# Altium footprint library Package_DFN_QFN.PcbLib: 557 footprints (part 8 of 35)
Each footprint in its own frame and in the unit in brackets; x right, y up, seen from the top. Pads: shape width x height; smd on the part's side, far side on the other; paste and mask are expansions set on the pad; w line width, h text height; cw(c..) or ccw(c..) is an arc to the next point about the centre after c.
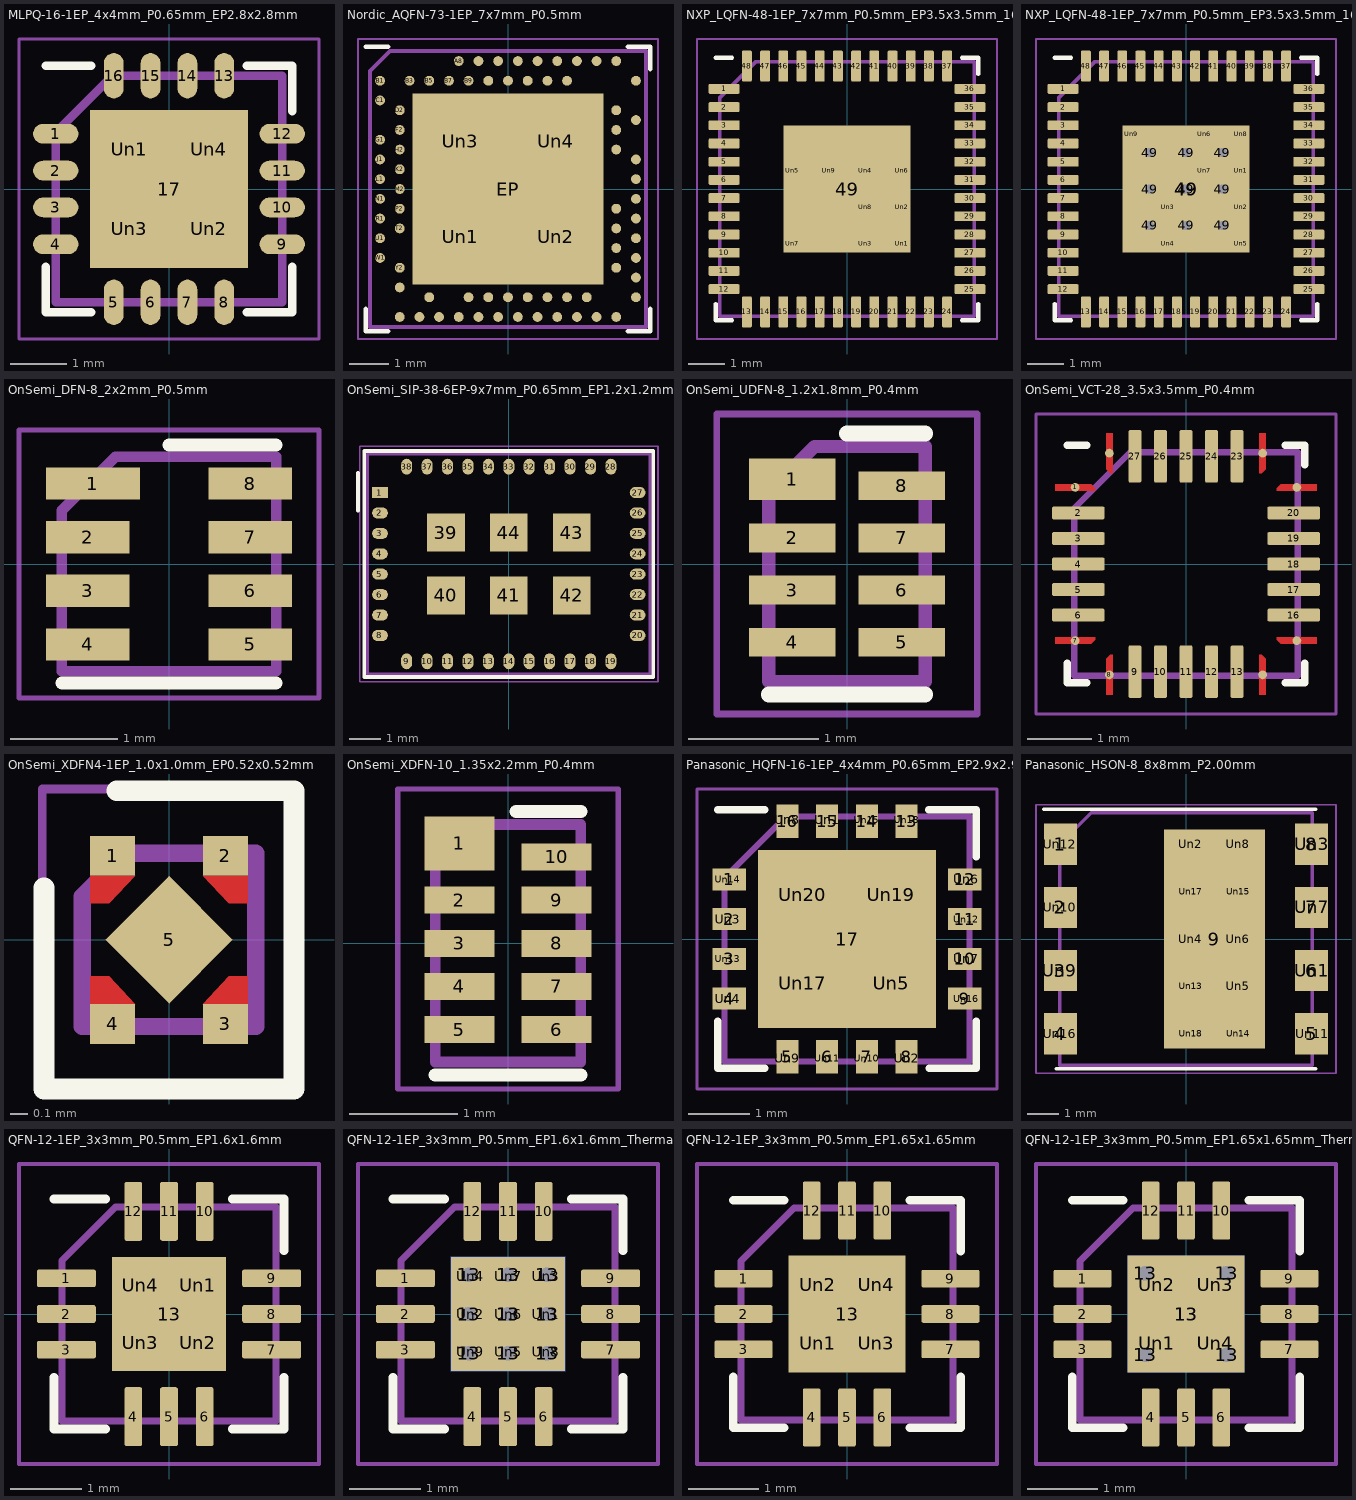
[diagram p7: the footprints below, top view; thin cyan lines are the x and y axes]

## MLPQ-16-1EP_4x4mm_P0.65mm_EP2.8x2.8mm [mm]
pads (21):
  rrect100% 0.8x0.35 smd: 1(-2,0.975) 2(-2,0.325) 3(-2,-0.325) 4(-2,-0.975) 9(2,-0.975) 10(2,-0.325) 11(2,0.325) 12(2,0.975)
  rrect100% 0.35x0.8 smd: 5(-0.975,-2) 6(-0.325,-2) 7(0.325,-2) 8(0.975,-2) 13(0.975,2) 14(0.325,2) 15(-0.325,2) 16(-0.975,2)
  rect 2.8x2.8 smd: 17(0,0)
  rect 1.13x1.13 on Top Paste: Un1(-0.7,0.7) Un2(0.7,-0.7) Un3(-0.7,-0.7) Un4(0.7,0.7)
F.SilkS:
  lines w0.15: -2.175,-1.375 -2.175,-2.175 -1.375,-2.175 ; -2.175,2.175 -1.375,2.175 ; 1.375,-2.175 2.175,-2.175 2.175,-1.375 ; 1.375,2.175 2.175,2.175 2.175,1.375
F.CrtYd:
  lines w0.05: -2.65,-2.65 2.65,-2.65 2.65,2.65 -2.65,2.65 -2.65,-2.65
F.Fab:
  lines w0.15: -2,-2 -2,1 -1,2 2,2 2,-2 -2,-2
  text "'.Designator'" at -4.047,-0.84 h1

## Nordic_AQFN-73-1EP_7x7mm_P0.5mm [mm]
pads (78):
  round 0.25 smd: A8(-1.25,3.25) A10(-0.75,3.25) A12(-0.25,3.25) A14(0.25,3.25) A16(0.75,3.25) A18(1.25,3.25) A20(1.75,3.25) A22(2.25,3.25) A23(2.75,3.25) AA24(3.25,-2.25) AB2(-2.75,-2.5) AC5(-2,-2.75) AC9(-1,-2.75) AC11(-0.5,-2.75) AC13(0,-2.75) AC15(0.5,-2.75) AC17(1,-2.75) AC19(1.5,-2.75) AC21(2,-2.75) AC24(3.25,-2.75) AD2(-2.75,-3.25) AD4(-2.25,-3.25) AD6(-1.75,-3.25) AD8(-1.25,-3.25) AD10(-0.75,-3.25) AD12(-0.25,-3.25) AD14(0.25,-3.25) AD16(0.75,-3.25) AD18(1.25,-3.25) AD20(1.75,-3.25) AD22(2.25,-3.25) AD23(2.75,-3.25) B1(-3.25,2.75) B3(-2.5,2.75) B5(-2,2.75) B7(-1.5,2.75) B9(-1,2.75) B11(-0.5,2.75) B13(0,2.75) B15(0.5,2.75) B17(1,2.75) B19(1.5,2.75) B24(3.25,2.75) C1(-3.25,2.25) D2(-2.75,2) D23(2.75,2) E24(3.25,1.75) F2(-2.75,1.5) F23(2.75,1.5) G1(-3.25,1.25) H2(-2.75,1) H23(2.75,1) J1(-3.25,0.75) J24(3.25,0.75) K2(-2.75,0.5) L1(-3.25,0.25) L24(3.25,0.25) M2(-2.75,0) N1(-3.25,-0.25) N24(3.25,-0.25) P2(-2.75,-0.5) P23(2.75,-0.5) R1(-3.25,-0.75) R24(3.25,-0.75) T2(-2.75,-1) T23(2.75,-1) U1(-3.25,-1.25) U24(3.25,-1.25) V23(2.75,-1.5) W1(-3.25,-1.75) W24(3.25,-1.75) Y2(-2.75,-2) Y23(2.75,-2)
  rect 4.85x4.85 smd: EP(0,0)
  rect 2x2 on Top Paste: Un1(-1.212,-1.212) Un2(1.212,-1.212) Un3(-1.212,1.212) Un4(1.212,1.212)
F.SilkS:
  lines w0.12: -3.61,-3.05 -3.61,-3.61 -3.05,-3.61 ; -3.61,3.61 -3.05,3.61 ; 3.05,-3.61 3.61,-3.61 3.61,-3.05 ; 3.05,3.61 3.61,3.61 3.61,3.05
F.CrtYd:
  lines w0.05: -3.81,-3.81 -3.81,3.81 3.81,3.81 3.81,-3.81 -3.81,-3.81
F.Fab:
  lines w0.1: -3.5,-3.5 -3.5,3 -3,3.5 3.5,3.5 3.5,-3.5 -3.5,-3.5
  text "'.Designator'" at -4.047,-0.84 h1

## NXP_LQFN-48-1EP_7x7mm_P0.5mm_EP3.5x3.5mm_16xMask0.45x0.45 [mm]
pads (65):
  rrect25% 0.85x0.27 smd: 1(-3.375,2.75) 2(-3.375,2.25) 3(-3.375,1.75) 4(-3.375,1.25) 5(-3.375,0.75) 6(-3.375,0.25) 7(-3.375,-0.25) 8(-3.375,-0.75) 9(-3.375,-1.25) 10(-3.375,-1.75) 11(-3.375,-2.25) 12(-3.375,-2.75) 25(3.375,-2.75) 26(3.375,-2.25) 27(3.375,-1.75) 28(3.375,-1.25) 29(3.375,-0.75) 30(3.375,-0.25) 31(3.375,0.25) 32(3.375,0.75) 33(3.375,1.25) 34(3.375,1.75) 35(3.375,2.25) 36(3.375,2.75)
  rrect25% 0.27x0.85 smd: 13(-2.75,-3.375) 14(-2.25,-3.375) 15(-1.75,-3.375) 16(-1.25,-3.375) 17(-0.75,-3.375) 18(-0.25,-3.375) 19(0.25,-3.375) 20(0.75,-3.375) 21(1.25,-3.375) 22(1.75,-3.375) 23(2.25,-3.375) 24(2.75,-3.375) 37(2.75,3.375) 38(2.25,3.375) 39(1.75,3.375) 40(1.25,3.375) 41(0.75,3.375) 42(0.25,3.375) 43(-0.25,3.375) 44(-0.75,3.375) 45(-1.25,3.375) 46(-1.75,3.375) 47(-2.25,3.375) 48(-2.75,3.375)
  rect 3.5x3.5 smd: 49(0,0)
  rect 0.45x0.45 on Top Paste: Un1(1.5,-1.5) Un2(1.5,-0.5) Un3(0.5,-1.5) Un4(0.5,0.5) Un5(-1.5,0.5) Un6(1.5,0.5) Un7(-1.5,-1.5) Un8(0.5,-0.5) Un9(-0.5,0.5) Un10(-0.5,-0.5) Un11(-1.5,-0.5) Un12(1.5,1.5) Un13(-0.5,1.5) Un14(0.5,1.5) Un15(-1.5,1.5) Un16(-0.5,-1.5)
F.SilkS:
  lines w0.12: -3.61,-3.16 -3.61,-3.61 -3.16,-3.61 ; -3.61,3.61 -3.16,3.61 ; 3.16,-3.61 3.61,-3.61 3.61,-3.16 ; 3.16,3.61 3.61,3.61 3.61,3.16
F.CrtYd:
  lines w0.05: -4.12,-4.12 4.12,-4.12 4.12,4.12 -4.12,4.12 -4.12,-4.12
F.Fab:
  lines w0.1: -3.5,-3.5 3.5,-3.5 3.5,3.5 -2.5,3.5 -3.5,2.5 -3.5,-3.5
  text "'.Designator'" at -4.047,-0.84 h1

## NXP_LQFN-48-1EP_7x7mm_P0.5mm_EP3.5x3.5mm_16xMask0.45x0.45_ThermalVias [mm]
pads (75):
  rrect25% 0.85x0.27 smd: 1(-3.375,2.75) 2(-3.375,2.25) 3(-3.375,1.75) 4(-3.375,1.25) 5(-3.375,0.75) 6(-3.375,0.25) 7(-3.375,-0.25) 8(-3.375,-0.75) 9(-3.375,-1.25) 10(-3.375,-1.75) 11(-3.375,-2.25) 12(-3.375,-2.75) 25(3.375,-2.75) 26(3.375,-2.25) 27(3.375,-1.75) 28(3.375,-1.25) 29(3.375,-0.75) 30(3.375,-0.25) 31(3.375,0.25) 32(3.375,0.75) 33(3.375,1.25) 34(3.375,1.75) 35(3.375,2.25) 36(3.375,2.75)
  rrect25% 0.27x0.85 smd: 13(-2.75,-3.375) 14(-2.25,-3.375) 15(-1.75,-3.375) 16(-1.25,-3.375) 17(-0.75,-3.375) 18(-0.25,-3.375) 19(0.25,-3.375) 20(0.75,-3.375) 21(1.25,-3.375) 22(1.75,-3.375) 23(2.25,-3.375) 24(2.75,-3.375) 37(2.75,3.375) 38(2.25,3.375) 39(1.75,3.375) 40(1.25,3.375) 41(0.75,3.375) 42(0.25,3.375) 43(-0.25,3.375) 44(-0.75,3.375) 45(-1.25,3.375) 46(-1.75,3.375) 47(-2.25,3.375) 48(-2.75,3.375)
  round 0.55 hole 0.25: 49(-1,-1) 49(-1,0) 49(-1,1) 49(0,-1) 49(0,0) 49(0,1) 49(1,-1) 49(1,0) 49(1,1)
  rrect12% 2.55x2.55 smd far side: 49(0,0)
  rect 3.5x3.5 smd: 49(0,0)
  rect 0.45x0.45 on Top Paste: Un1(1.5,0.5) Un2(1.5,-0.5) Un3(-0.5,-0.5) Un4(-0.5,-1.5) Un5(1.5,-1.5) Un6(0.5,1.5) Un7(0.5,0.5) Un8(1.5,1.5) Un9(-1.5,1.5) Un10(0.5,-1.5) Un11(-0.5,0.5) Un12(-1.5,-1.5) Un13(-1.5,-0.5) Un14(-1.5,0.5) Un15(-0.5,1.5) Un16(0.5,-0.5)
F.SilkS:
  lines w0.12: -3.61,-3.16 -3.61,-3.61 -3.16,-3.61 ; -3.61,3.61 -3.16,3.61 ; 3.16,-3.61 3.61,-3.61 3.61,-3.16 ; 3.16,3.61 3.61,3.61 3.61,3.16
F.CrtYd:
  lines w0.05: -4.12,-4.12 4.12,-4.12 4.12,4.12 -4.12,4.12 -4.12,-4.12
F.Fab:
  lines w0.1: -3.5,-3.5 3.5,-3.5 3.5,3.5 -2.5,3.5 -3.5,2.5 -3.5,-3.5
  text "'.Designator'" at -4.047,-0.84 h1

## OnSemi_DFN-8_2x2mm_P0.5mm [mm]
pads (8):
  rect 0.88x0.3 smd: 1(-0.71,0.75)
  rect 0.78x0.3 smd: 2(-0.76,0.25) 3(-0.76,-0.25) 4(-0.76,-0.75) 5(0.76,-0.75) 6(0.76,-0.25) 7(0.76,0.25) 8(0.76,0.75)
F.SilkS:
  lines w0.12: -1,-1.11 1,-1.11 ; 0,1.11 1,1.11
F.CrtYd:
  lines w0.05: -1.4,-1.25 1.4,-1.25 1.4,1.25 -1.4,1.25 -1.4,-1.25
F.Fab:
  lines w0.1: -1,-1 -1,0.5 -0.5,1 1,1 1,-1 -1,-1
  text "'.Designator'" at -1.619,-0.336 h0.4

## OnSemi_SIP-38-6EP-9x7mm_P0.65mm_EP1.2x1.2mm [mm]
pads (44):
  rect 0.5x0.35 smd: 1(-4.1,2.275)
  rrect100% 0.501x0.351 smd: 2(-4.1,1.625) 3(-4.1,0.975) 4(-4.1,0.325) 5(-4.1,-0.325) 6(-4.1,-0.975) 7(-4.1,-1.625) 8(-4.1,-2.275) 20(4.1,-2.275) 21(4.1,-1.625) 22(4.1,-0.975) 23(4.1,-0.325) 24(4.1,0.325) 25(4.1,0.975) 26(4.1,1.625) 27(4.1,2.275)
  rrect100% 0.351x0.501 smd: 9(-3.25,-3.1) 10(-2.6,-3.1) 11(-1.95,-3.1) 12(-1.3,-3.1) 13(-0.65,-3.1) 14(0,-3.1) 15(0.65,-3.1) 16(1.3,-3.1) 17(1.95,-3.1) 18(2.6,-3.1) 19(3.25,-3.1) 28(3.25,3.1) 29(2.6,3.1) 30(1.95,3.1) 31(1.3,3.1) 32(0.65,3.1) 33(0,3.1) 34(-0.65,3.1) 35(-1.3,3.1) 36(-1.95,3.1) 37(-2.6,3.1) 38(-3.25,3.1)
  rect 1.2x1.2 smd: 39(-2,1) 40(-2,-1) 41(0,-1) 42(2,-1) 43(2,1) 44(0,1)
F.SilkS:
  lines w0.12: -4.8,1.7 -4.8,2.9 ; -4.6,-3.6 -4.6,3.6 4.6,3.6 4.6,-3.6 -4.6,-3.6
F.CrtYd:
  lines w0.05: -4.75,-3.75 -4.75,3.75 4.75,3.75 4.75,-3.75 -4.75,-3.75
F.Fab:
  lines w0.1: -4.5,-3.5 -4.5,3.5 4.5,3.5 4.5,-3.5 -4.5,-3.5
  text "'.Designator'" at -4.047,-0.84 h1

## OnSemi_UDFN-8_1.2x1.8mm_P0.4mm [mm]
pads (8):
  rect 0.66x0.32 smd: 1(-0.42,0.65)
  rect 0.66x0.22 smd: 2(-0.42,0.2) 3(-0.42,-0.2) 4(-0.42,-0.6) 5(0.42,-0.6) 6(0.42,-0.2) 7(0.42,0.2) 8(0.42,0.6)
F.SilkS:
  lines w0.12: -0.6,-1 0.6,-1 ; 0,1 0.6,1
F.CrtYd:
  lines w0.05: -1,-1.15 1,-1.15 1,1.15 -1,1.15 -1,-1.15
F.Fab:
  lines w0.1: -0.6,-0.9 0.6,-0.9 0.6,0.9 -0.25,0.9 -0.6,0.55 -0.6,-0.9
  text "'.Designator'" at 0.307,-1.219 h0.3

## OnSemi_VCT-28_3.5x3.5mm_P0.4mm [mm]
pads (28):
  round 0.136 smd: 1(-1.737,1.2) 7(-1.737,-1.2) 8(-1.2,-1.737) 14(1.2,-1.737) 15(1.737,-1.2) 21(1.737,1.2) 22(1.2,1.737) 28(-1.2,1.737)
  rrect25% 0.825x0.2 smd: 2(-1.687,0.8) 3(-1.687,0.4) 4(-1.687,0) 5(-1.687,-0.4) 6(-1.687,-0.8) 16(1.687,-0.8) 17(1.687,-0.4) 18(1.687,0) 19(1.687,0.4) 20(1.687,0.8)
  rrect25% 0.2x0.825 smd: 9(-0.8,-1.687) 10(-0.4,-1.687) 11(0,-1.687) 12(0.4,-1.687) 13(0.8,-1.687) 23(0.8,1.687) 24(0.4,1.687) 25(0,1.687) 26(-0.4,1.687) 27(-0.8,1.687)
F.Cu:
  region: -1.425,1.189 -1.425,1.15 -2.05,1.15 -2.05,1.25 -1.486,1.25
  region: -1.425,-1.189 -1.486,-1.25 -2.05,-1.25 -2.05,-1.15 -1.425,-1.15
  region: -1.15,-2.05 -1.25,-2.05 -1.25,-1.486 -1.189,-1.425 -1.15,-1.425
  region: 1.25,-1.486 1.25,-2.05 1.15,-2.05 1.15,-1.425 1.189,-1.425
  region: 2.05,-1.25 1.486,-1.25 1.425,-1.189 1.425,-1.15 2.05,-1.15
  region: 2.05,1.15 1.425,1.15 1.425,1.189 1.486,1.25 2.05,1.25
  region: 1.25,1.486 1.189,1.425 1.15,1.425 1.15,2.05 1.25,2.05
  region: -1.15,1.425 -1.189,1.425 -1.25,1.486 -1.25,2.05 -1.15,2.05
F.SilkS:
  lines w0.12: -1.86,-1.56 -1.86,-1.86 -1.56,-1.86 ; -1.86,1.86 -1.56,1.86 ; 1.56,-1.86 1.86,-1.86 1.86,-1.56 ; 1.56,1.86 1.86,1.86 1.86,1.56
F.Paste:
  region: -1.425,1.189 -1.425,1.15 -2.05,1.15 -2.05,1.25 -1.486,1.25
  region: -1.425,-1.189 -1.486,-1.25 -2.05,-1.25 -2.05,-1.15 -1.425,-1.15
  region: -1.15,-2.05 -1.25,-2.05 -1.25,-1.486 -1.189,-1.425 -1.15,-1.425
  region: 1.25,-1.486 1.25,-2.05 1.15,-2.05 1.15,-1.425 1.189,-1.425
  region: 2.05,-1.25 1.486,-1.25 1.425,-1.189 1.425,-1.15 2.05,-1.15
  region: 2.05,1.15 1.425,1.15 1.425,1.189 1.486,1.25 2.05,1.25
  region: 1.25,1.486 1.189,1.425 1.15,1.425 1.15,2.05 1.25,2.05
  region: -1.15,1.425 -1.189,1.425 -1.25,1.486 -1.25,2.05 -1.15,2.05
F.Mask:
  region: -1.425,1.189 -1.425,1.15 -2.05,1.15 -2.05,1.25 -1.486,1.25
  region: -1.425,-1.189 -1.486,-1.25 -2.05,-1.25 -2.05,-1.15 -1.425,-1.15
  region: -1.15,-2.05 -1.25,-2.05 -1.25,-1.486 -1.189,-1.425 -1.15,-1.425
  region: 1.25,-1.486 1.25,-2.05 1.15,-2.05 1.15,-1.425 1.189,-1.425
  region: 2.05,-1.25 1.486,-1.25 1.425,-1.189 1.425,-1.15 2.05,-1.15
  region: 2.05,1.15 1.425,1.15 1.425,1.189 1.486,1.25 2.05,1.25
  region: 1.25,1.486 1.189,1.425 1.15,1.425 1.15,2.05 1.25,2.05
  region: -1.15,1.425 -1.189,1.425 -1.25,1.486 -1.25,2.05 -1.15,2.05
F.CrtYd:
  lines w0.05: -2.35,-2.35 2.35,-2.35 2.35,2.35 -2.35,2.35 -2.35,-2.35
F.Fab:
  lines w0.1: -1.75,-1.75 1.75,-1.75 1.75,1.75 -0.875,1.75 -1.75,0.875 -1.75,-1.75
  text "'.Designator'" at -3.559,-0.737 h0.88

## OnSemi_XDFN4-1EP_1.0x1.0mm_EP0.52x0.52mm [mm]
pads (5):
  rect 0.26x0.23 smd: 1(-0.325,0.485) 2(0.325,0.485) 3(0.325,-0.485) 4(-0.325,-0.485)
  rect 0.52x0.52 smd rot 45: 5(0,0)
F.Cu:
  region: -0.345,0.21 -0.455,0.21 -0.455,0.37 -0.195,0.37
  region: 0.455,0.21 0.345,0.21 0.195,0.37 0.455,0.37
  region: 0.455,-0.37 0.195,-0.37 0.345,-0.21 0.455,-0.21
  region: -0.195,-0.37 -0.455,-0.37 -0.455,-0.21 -0.345,-0.21
F.SilkS:
  lines w0.12: -0.72,0.3 -0.72,-0.86 0.72,-0.86 0.72,0.86 -0.3,0.86
F.Paste:
  region: -0.345,0.21 -0.455,0.21 -0.455,0.37 -0.195,0.37
  region: 0.455,0.21 0.345,0.21 0.195,0.37 0.455,0.37
  region: 0.455,-0.37 0.195,-0.37 0.345,-0.21 0.455,-0.21
  region: -0.195,-0.37 -0.455,-0.37 -0.455,-0.21 -0.345,-0.21
F.Mask:
  region: -0.345,0.21 -0.455,0.21 -0.455,0.37 -0.195,0.37
  region: 0.455,0.21 0.345,0.21 0.195,0.37 0.455,0.37
  region: 0.455,-0.37 0.195,-0.37 0.345,-0.21 0.455,-0.21
  region: -0.195,-0.37 -0.455,-0.37 -0.455,-0.21 -0.345,-0.21
F.CrtYd:
  lines w0.05: -0.73,-0.85 0.73,-0.85 0.73,0.87 -0.73,0.87 -0.73,-0.85
F.Fab:
  lines w0.1: -0.5,-0.5 -0.5,0.25 -0.25,0.5 0.5,0.5 0.5,-0.5 -0.5,-0.5
  text "'.Designator'" at -2.063,-1.73 h0.5

## OnSemi_XDFN-10_1.35x2.2mm_P0.4mm [mm]
pads (10):
  rect 0.65x0.5 smd: 1(-0.45,0.925)
  rect 0.65x0.25 smd: 2(-0.45,0.4) 3(-0.45,0) 4(-0.45,-0.4) 5(-0.45,-0.8) 6(0.45,-0.8) 7(0.45,-0.4) 8(0.45,0) 9(0.45,0.4) 10(0.45,0.8)
F.SilkS:
  lines w0.12: -0.675,-1.22 0.675,-1.22 ; 0.075,1.22 0.675,1.22
F.CrtYd:
  lines w0.05: -1.02,-1.35 1.02,-1.35 1.02,1.43 -1.02,1.43 -1.02,-1.35
F.Fab:
  lines w0.1: -0.675,-1.1 -0.675,0.825 -0.4,1.1 0.675,1.1 0.675,-1.1 -0.675,-1.1
  text "'.Designator'" at 0.42,-2.023 h0.5

## Panasonic_HQFN-16-1EP_4x4mm_P0.65mm_EP2.9x2.9mm [mm]
pads (37):
  rect 0.55x0.36 smd: 1(-1.925,0.975) 2(-1.925,0.325) 3(-1.925,-0.325) 4(-1.925,-0.975) 9(1.925,-0.975) 10(1.925,-0.325) 11(1.925,0.325) 12(1.925,0.975)
  rect 0.36x0.55 smd: 5(-0.975,-1.925) 6(-0.325,-1.925) 7(0.325,-1.925) 8(0.975,-1.925) 13(0.975,1.925) 14(0.325,1.925) 15(-0.325,1.925) 16(-0.975,1.925)
  rect 2.9x2.9 smd: 17(0,0)
  rect 0.36x0.5 on Top Paste: Un1(-0.325,1.95) Un2(0.975,-1.95) Un8(-0.975,1.95) Un9(-0.975,-1.95) Un10(0.325,-1.95) Un11(-0.325,-1.95) Un15(0.325,1.95) Un18(0.975,1.95)
  rect 0.5x0.36 on Top Paste: Un3(-1.95,0.325) Un4(-1.95,-0.975) Un6(1.95,0.975) Un7(1.95,-0.325) Un12(1.95,0.325) Un13(-1.95,-0.325) Un14(-1.95,0.975) Un16(1.95,-0.975)
  rect 1.05x1.05 on Top Paste: Un5(0.725,-0.725) Un17(-0.725,-0.725) Un19(0.725,0.725) Un20(-0.725,0.725)
F.SilkS:
  lines w0.12: -2.11,-1.34 -2.11,-2.11 -1.34,-2.11 ; -2.11,2.11 -1.34,2.11 ; 1.33,2.11 2.11,2.11 2.11,1.34 ; 1.34,-2.11 2.11,-2.11 2.11,-1.34
F.CrtYd:
  lines w0.05: -2.45,-2.45 2.45,-2.45 2.45,2.45 -2.45,2.45 -2.45,-2.45
F.Fab:
  lines w0.1: -2,-2 -2,1 -1,2 2,2 2,-2 -2,-2
  text "'.Designator'" at -4.047,-0.84 h1

## Panasonic_HSON-8_8x8mm_P2.00mm [mm]
pads (27):
  rect 1.05x1.3 smd: 1(-3.975,3) 2(-3.975,1) 3(-3.975,-1) 4(-3.975,-3) 5(3.975,-3) 6(3.975,-1) 7(3.975,1) 8(3.975,3)
  rect 3.2x6.94 smd: 9(0.9,0)
  rect 1x1.3 on Top Paste: Un1(4,-1) Un3(4,3) Un7(4,1) Un9(-4,-1) Un10(-4,1) Un11(4,-3) Un12(-4,3) Un16(-4,-3)
  rect 0.9x0.9 on Top Paste: Un2(0.15,3) Un4(0.15,0) Un5(1.65,-1.5) Un6(1.65,0) Un8(1.65,3) Un13(0.15,-1.5) Un14(1.65,-3) Un15(1.65,1.5) Un17(0.15,1.5) Un18(0.15,-3)
F.SilkS:
  lines w0.12: -4.5,4.11 4.11,4.11 ; -4.11,-4.11 4.11,-4.11
F.CrtYd:
  lines w0.05: -4.75,-4.25 4.75,-4.25 4.75,4.25 -4.75,4.25 -4.75,-4.25
F.Fab:
  lines w0.1: -4,-4 4,-4 4,4 -3,4 -4,3 -4,-4
  text "'.Designator'" at -4.047,-0.84 h1

## QFN-12-1EP_3x3mm_P0.5mm_EP1.6x1.6mm [mm]
pads (17):
  rrect25% 0.825x0.25 smd: 1(-1.438,0.5) 2(-1.438,0) 3(-1.438,-0.5) 7(1.438,-0.5) 8(1.438,0) 9(1.438,0.5)
  rrect25% 0.25x0.825 smd: 4(-0.5,-1.438) 5(0,-1.438) 6(0.5,-1.438) 10(0.5,1.438) 11(0,1.438) 12(-0.5,1.438)
  rect 1.6x1.6 smd: 13(0,0)
  rrect25% 0.64x0.64 on Top Paste: Un1(0.4,0.4) Un2(0.4,-0.4) Un3(-0.4,-0.4) Un4(-0.4,0.4)
F.SilkS:
  lines w0.12: -1.61,-0.885 -1.61,-1.61 -0.885,-1.61 ; -1.61,1.61 -0.885,1.61 ; 0.885,-1.61 1.61,-1.61 1.61,-0.885 ; 0.885,1.61 1.61,1.61 1.61,0.885
F.CrtYd:
  lines w0.05: -2.1,-2.1 2.1,-2.1 2.1,2.1 -2.1,2.1 -2.1,-2.1
F.Fab:
  lines w0.1: -1.5,-1.5 -1.5,0.75 -0.75,1.5 1.5,1.5 1.5,-1.5 -1.5,-1.5
  text "'.Designator'" at -3.033,-0.628 h0.75

## QFN-12-1EP_3x3mm_P0.5mm_EP1.6x1.6mm_ThermalVias [mm]
pads (32):
  rrect25% 0.825x0.25 smd: 1(-1.438,0.5) 2(-1.438,0) 3(-1.438,-0.5) 7(1.438,-0.5) 8(1.438,0) 9(1.438,0.5)
  rrect25% 0.25x0.825 smd: 4(-0.5,-1.438) 5(0,-1.438) 6(0.5,-1.438) 10(0.5,1.438) 11(0,1.438) 12(-0.5,1.438)
  round 0.5 hole 0.2: 13(-0.55,-0.55) 13(-0.55,0) 13(-0.55,0.55) 13(0,-0.55) 13(0,0) 13(0,0.55) 13(0.55,-0.55) 13(0.55,0) 13(0.55,0.55)
  rect 1.6x1.6 smd: 13(0,0)
  rect 1.6x1.6 smd far side: 13(0,0)
  rrect25% 0.46x0.46 on Top Paste: Un1(0.53,0) Un2(-0.53,0) Un3(0.53,0.53) Un4(-0.53,0.53) Un5(0,-0.53) Un6(0,0) Un7(0,0.53) Un8(0.53,-0.53) Un9(-0.53,-0.53)
F.SilkS:
  lines w0.12: -1.61,-0.885 -1.61,-1.61 -0.885,-1.61 ; -1.61,1.61 -0.885,1.61 ; 0.885,-1.61 1.61,-1.61 1.61,-0.885 ; 0.885,1.61 1.61,1.61 1.61,0.885
F.CrtYd:
  lines w0.05: -2.1,-2.1 -2.1,2.1 2.1,2.1 2.1,-2.1 -2.1,-2.1
F.Fab:
  lines w0.1: -1.5,-1.5 1.5,-1.5 1.5,1.5 -0.75,1.5 -1.5,0.75 -1.5,-1.5
  text "'.Designator'" at -3.033,-0.628 h0.75

## QFN-12-1EP_3x3mm_P0.5mm_EP1.65x1.65mm [mm]
pads (17):
  rrect25% 0.825x0.25 smd: 1(-1.462,0.5) 2(-1.462,0) 3(-1.462,-0.5) 7(1.462,-0.5) 8(1.462,0) 9(1.462,0.5)
  rrect25% 0.25x0.825 smd: 4(-0.5,-1.462) 5(0,-1.462) 6(0.5,-1.462) 10(0.5,1.462) 11(0,1.462) 12(-0.5,1.462)
  rect 1.65x1.65 smd: 13(0,0)
  rrect25% 0.67x0.67 on Top Paste: Un1(-0.41,-0.41) Un2(-0.41,0.41) Un3(0.41,-0.41) Un4(0.41,0.41)
F.SilkS:
  lines w0.12: -1.61,-0.885 -1.61,-1.61 -0.885,-1.61 ; -1.61,1.61 -0.885,1.61 ; 0.885,-1.61 1.61,-1.61 1.61,-0.885 ; 0.885,1.61 1.61,1.61 1.61,0.885
F.CrtYd:
  lines w0.05: -2.12,-2.12 -2.12,2.12 2.12,2.12 2.12,-2.12 -2.12,-2.12
F.Fab:
  lines w0.1: -1.5,-1.5 1.5,-1.5 1.5,1.5 -0.75,1.5 -1.5,0.75 -1.5,-1.5
  text "'.Designator'" at -3.033,-0.628 h0.75

## QFN-12-1EP_3x3mm_P0.5mm_EP1.65x1.65mm_ThermalVias [mm]
pads (22):
  rrect25% 0.825x0.25 smd: 1(-1.462,0.5) 2(-1.462,0) 3(-1.462,-0.5) 7(1.462,-0.5) 8(1.462,0) 9(1.462,0.5)
  rrect25% 0.25x0.825 smd: 4(-0.5,-1.462) 5(0,-1.462) 6(0.5,-1.462) 10(0.5,1.462) 11(0,1.462) 12(-0.5,1.462)
  round 0.5 hole 0.2: 13(-0.575,-0.575) 13(-0.575,0.575) 13(0.575,-0.575) 13(0.575,0.575)
  rect 1.65x1.65 smd far side: 13(0,0)
  rect 1.65x1.65 smd: 13(0,0)
  rrect25% 0.71x0.71 on Top Paste: Un1(-0.41,-0.41) Un2(-0.41,0.41) Un3(0.41,0.41) Un4(0.41,-0.41)
F.SilkS:
  lines w0.12: -1.61,-0.885 -1.61,-1.61 -0.885,-1.61 ; -1.61,1.61 -0.885,1.61 ; 0.885,-1.61 1.61,-1.61 1.61,-0.885 ; 0.885,1.61 1.61,1.61 1.61,0.885
F.CrtYd:
  lines w0.05: -2.12,-2.12 2.12,-2.12 2.12,2.12 -2.12,2.12 -2.12,-2.12
F.Fab:
  lines w0.1: -1.5,-1.5 1.5,-1.5 1.5,1.5 -0.75,1.5 -1.5,0.75 -1.5,-1.5
  text "'.Designator'" at -3.033,-0.628 h0.75